# Altium footprint library ATROTECH.PcbLib: 334 footprints (part 2 of 21)
Each footprint in its own frame and in the unit in brackets; x right, y up, seen from the top. Pads: shape width x height; smd on the part's side, far side on the other; paste and mask are expansions set on the pad; w line width, h text height; cw(c..) or ccw(c..) is an arc to the next point about the centre after c.
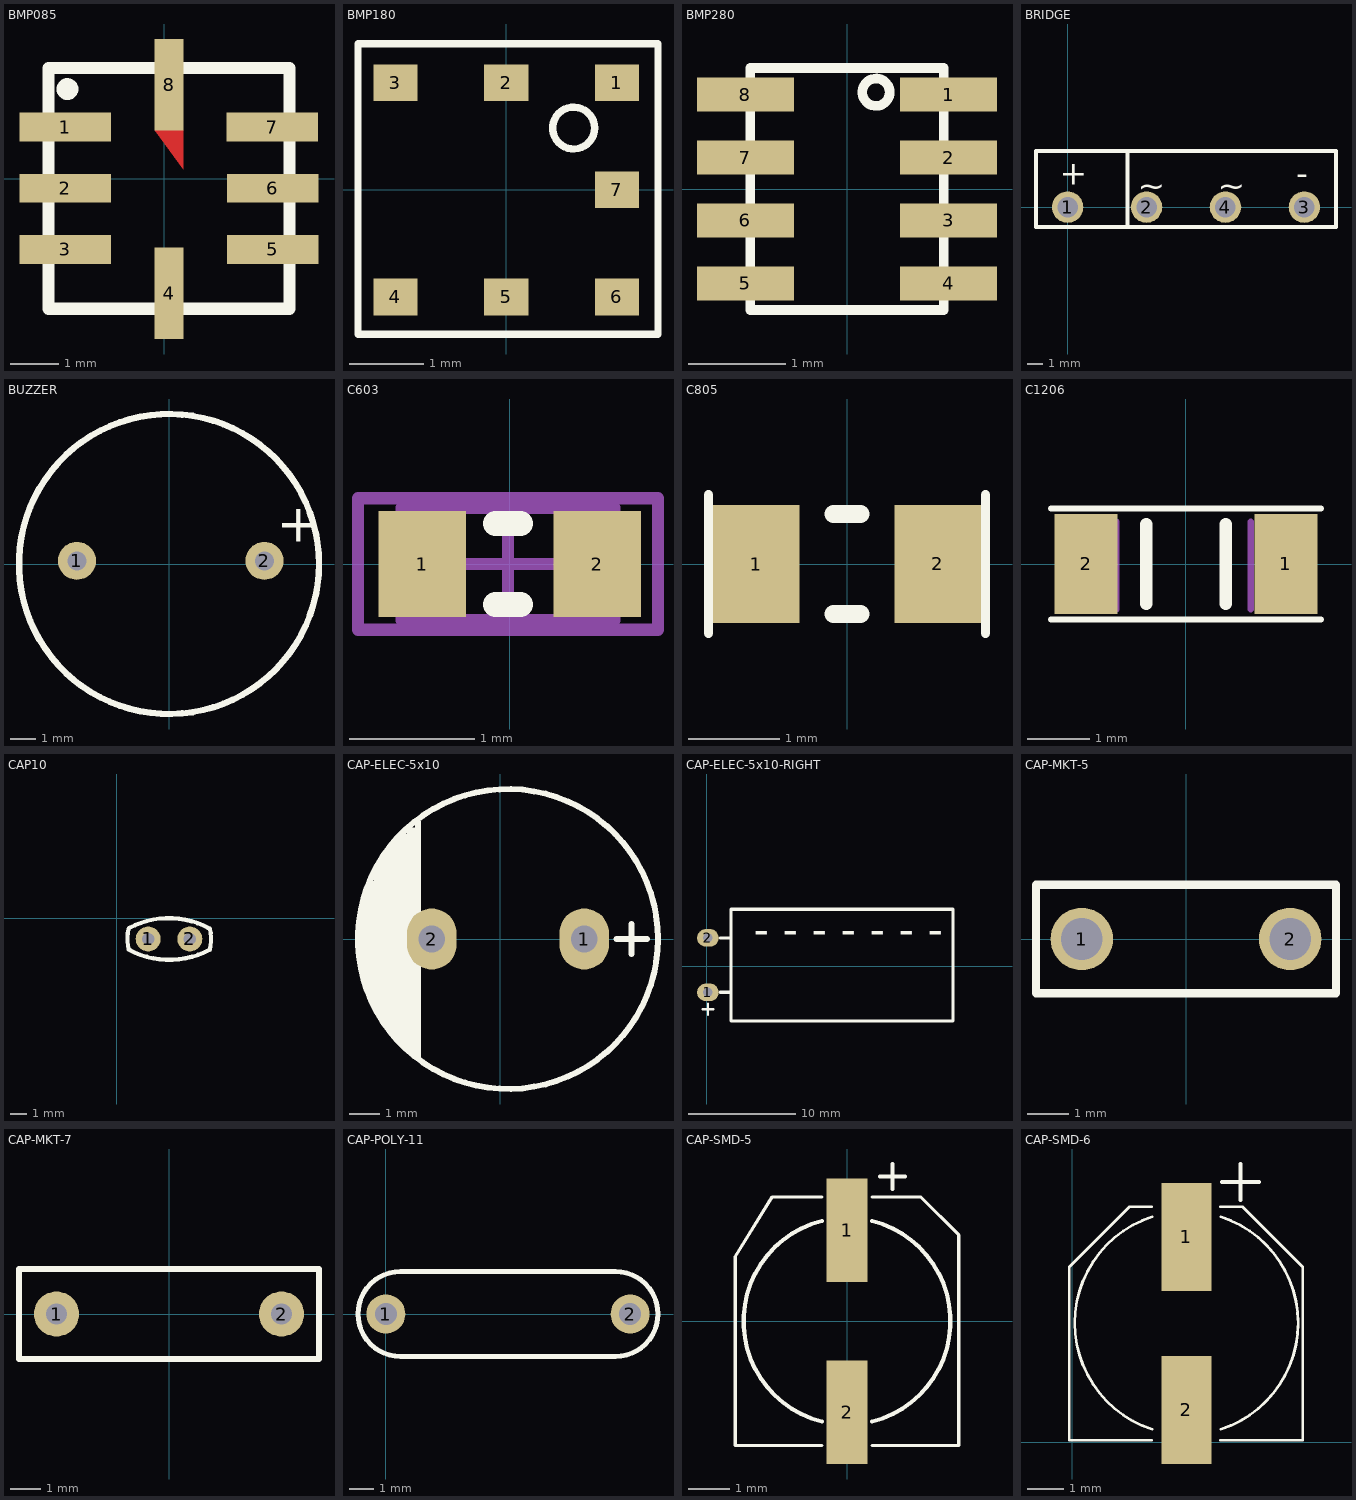
[diagram p1: the footprints below, top view; thin cyan lines are the x and y axes]

## BMP085 [mm] "Digital pressure sensor"
pads (8):
  rect 1.9x0.6 smd: 1(-2.05,1.07) 2(-2.05,-0.2) 3(-2.05,-1.47) 5(2.25,-1.47) 6(2.25,-0.2) 7(2.24,1.07)
  rect 0.6x1.9 smd: 4(0.1,-2.38) 8(0.1,1.95)
Top Layer:
  region: -0.2,1 0.4,1 0.4,0.6 0.4,0.2
Top Overlay:
  circle w0.254: c-2.01,1.86 r0.1
  lines w0.254: -2.4,-2.7 -2.4,2.3 2.6,2.3 2.6,-2.7 -2.4,-2.7

## BMP180 [mm]
height 2
pads (7):
  rect 0.6x0.5 smd: 1(1.5,1.45) 2(0,1.45) 3(-1.5,1.45) 4(-1.5,-1.45) 5(0,-1.45) 6(1.5,-1.45) 7(1.5,0)
Top Overlay:
  circle w0.1: c0.913,0.836 r0.284
  lines w0.1: -2.008,-1.958 2.056,-1.958 2.056,1.979 -2.008,1.979 -2.008,-1.958
3D body "BMP180.STEP": height 0.98, standoff 0, extent -1.875,-1.778 1.925,1.822

## BMP280 [mm]
pads (8):
  rect 1x0.35 smd: 1(1.05,0.975) 2(1.05,0.325) 3(1.05,-0.325) 4(1.05,-0.975) 5(-1.05,-0.975) 6(-1.05,-0.325) 7(-1.05,0.325) 8(-1.05,0.975)
Top Overlay:
  circle w0.1: c0.3,1 r0.141
  lines w0.1: -1,-1.25 -1,1.25 1,1.25 1,-1.25 -1,-1.25
3D body "User Library-BST-BMP280.step": height 1, standoff 0, extent -1,-1.25 1,1.25

## BRIDGE [mm] "DIODE BRIDGE"
height 15
pads (4):
  round 2 hole 1.3: 1(0,0) 2(5,0) 3(15,0) 4(10,0)
Top Overlay:
  lines w0.254: 3.81,-1.27 3.81,3.556 ; -2,-1.27 -2,3.556 17,3.556 17,-1.27 -2,-1.27
  text "-" at 14.478,1.397 h1.52
  text "~" at 9.525,0.635 h1.52
  text "~" at 4.445,0.635 h1.52
  text "+" at -0.508,1.397 h1.52

## BUZZER [mil]
pads (2):
  round 60 hole 30: 1(-145,5) 2(150.28,5)
Top Overlay:
  circle w10: c0,0 r236.22
  text "+" at 170,35 h60
3D body "buzzer.stp": height 374.02, standoff -216.54, extent -236.21,-231.22 236.23,241.22

## C603 [mm]
pads (2):
  rect 0.7x0.85 smd: 1(-0.7,0) 2(0.7,0)
Top Overlay:
  lines w0.2: -0.113,-0.325 0.087,-0.325 ; -0.113,0.325 0.087,0.325
Mechanical 13:
  lines w0.1: -0.863,-0.45 0.837,-0.45 0.837,0.45 -0.863,0.45 -0.863,-0.45
Mechanical 15:
  lines w0.1: -0.463,0 0.437,0 ; -0.013,-0.45 -0.013,0.45 ; -1.213,-0.525 1.187,-0.525 1.187,0.525 -1.213,0.525 -1.213,-0.525
3D body "cap 0603.STEP": height 0.6, standoff 0, extent -0.762,-0.381 0.762,0.381

## C805 [mm]
pads (2):
  rect 0.95x1.3 smd: 1(-1,0) 2(1,0)
Top Overlay:
  lines w0.1: -1.524,-0.762 -1.524,0.762 ; 1.524,-0.762 1.524,0.762
  lines w0.2: -0.15,-0.55 0.15,-0.55 ; -0.15,0.55 0.15,0.55
3D body "User Library-0805 SMD Resistor (2).SLDPRT": height 0.78, standoff 0, extent -1,-0.625 1,0.625

## C1206 [mm]
pads (2):
  rect 1x1.6 smd: 1(1.6,0) 2(-1.6,0)
Top Overlay:
  lines w0.1: -2.159,-0.889 2.159,-0.889 ; -2.159,0.889 2.159,0.889
  lines w0.2: -0.635,-0.635 -0.635,0.635 ; 0.635,-0.635 0.635,0.635
Mechanical 13:
  lines w0.1: -1.113,-0.726 -1.113,0.674 ; 1.037,-0.726 1.037,0.674
3D body "User Library-1206 SMD Capacitor.step": height 1, standoff 0, extent -1.6,-0.8 1.6,0.8

## CAP10 [mil]
pads (2):
  round 60 hole 30: 1(75,-50) 2(175,-50)
Top Overlay:
  lines w10: 27.99,-25.75 ccw(c125,-50) 28.29,-75.45 ccw(c125.6,105.1) 223.41,-75.18 ; 29.18,-23.44 cw(c124.4,-205.1) 221.71,-24.55 ; 222.79,-75.73 ccw(c125,-50) 223.1,-25.48
3D body "Cap 100n.STEP": height 272.48, standoff -39.37, extent 11,-83.39 240.87,-16.6

## CAP-ELEC-5x10 [mil]
pads (2):
  oval 65x80 hole 35: 1(110,0) 2(-90,0)
Top Overlay:
  circle w7.87: c10,0 r196.85
  rectangle: -167.83,-74.62 -107.98,71.44
  lines w7.87: -180.91,-47 -180.91,46 ; -173.91,-63 -173.91,62 ; -167.83,-74.62 -167.83,71.44 ; -167.83,73.02 -107.98,73.02 ; -165.07,-77.77 -107.98,-77.77 ; -164.68,80.5 -107.98,80.5 ; -163.89,-84.86 -107.98,-84.86 ; -161.53,87.19 -107.98,87.19 ; -160.35,-91.94 -107.98,-91.94 ; -157.98,93.88 -107.98,93.88 ; -156.8,-98.64 -107.98,-98.64 ; -154.05,100.57 -107.98,100.57 ; -153.26,-105.33 -107.98,-105.72 ; -149.72,107.66 -107.98,107.66 ; -148.14,-112.42 -107.98,-112.42 ; -145.39,114.35 -107.98,114.35 ; -142.63,-119.9 -107.98,-119.9 ; -140.27,121.05 -107.98,121.05 ; -137.12,-127.38 -107.98,-127.38 ; -134.76,127.35 -134.36,127.74 -107.98,127.74 ; -130.82,-134.46 -107.98,-134.46 ; -128.46,134.43 -128.06,134.83 -107.98,134.83 ; -124.13,-141.16 -107.98,-141.16 ; -120.98,142.31 -107.98,142.31 ; -117.83,-146.67 -107.98,-146.67 ; -107.98,-155.72 -107.98,153.72 ; 152.13,0 192.13,0 ; 172.13,-20 172.13,20
3D body "SW3dPS-Cap electro 10x12.5x5.0mm.STEP": height 512.81, standoff -136.91, extent -187.7,-197 208,198.7

## CAP-ELEC-5x10-RIGHT [mil]
pads (2):
  oval 80x65 hole 35: 1(5,-95) 2(5,105)
Top Overlay:
  lines w7.87: -15,-157.13 25,-157.13 ; 5,-177.13 5,-137.13
  lines w11.81: 50,-95 85,-95 ; 50,105 85,105 ; 90,-200 905,-200 905,210 90,210 90,-200
  text "- - - - - - -" at 870,205 h196.85
3D body "User Library-eca-2em220.step": height 401.57, standoff -118.11, extent -6.7,-200 906.69,209.49

## CAP-MKT-5 [mm]
pads (2):
  round 1.5 hole 1: 1(-2.5,0) 2(2.5,0)
Top Overlay:
  lines w0.2: -3.6,-1.3 -3.6,1.3 3.6,1.3 3.6,-1.3 -3.6,-1.3
3D body "User Library-B32529-2_5X6_5X7_2.STEP": height 6.5, standoff -3, extent -3.6,-1.25 3.6,1.25

## CAP-MKT-7 [mm]
pads (2):
  round 1.5 hole 0.7: 1(-3.75,0) 2(3.75,0)
Top Overlay:
  lines w0.2: -5,-1.5 -5,1.5 5,1.5 5,-1.5 -5,-1.5
3D body: height 8, standoff 0, extent -5,-1.5 5,1.5

## CAP-POLY-11 [mm]
pads (2):
  round 1.6 hole 0.9: 1(0,0) 2(10,0)
Top Overlay:
  lines w0.2: 0.6,-1.738 cw(c0.6,0) 0.6,1.738 9.4,1.738 cw(c9.4,0) 9.4,-1.738 0.6,-1.738
3D body "__-6.STEP": height 11, standoff -3, extent -0.5,-1.75 10.5,1.75

## CAP-SMD-5 [mm]
pads (2):
  rect 1x2.5 smd: 1(0,2.2) 2(0,-2.2)
Top Overlay:
  lines w0.076: -0.6,-3 -2.7,-3 -2.7,1.562 ; -0.6,3 -1.813,3 ; 0.6,-3 2.7,-3 2.7,2.088 ; 0.6,3 1.788,3 ; -2.7,1.562 -1.813,3 ; -2.7,1.562 -1.813,3 ; 1.788,3 2.7,2.088 ; 1.788,3 2.7,2.088
  lines w0.1: -0.606,-2.425 cw(c0,0) -0.606,2.425 ; 0.606,-2.425 ccw(c0,0) 0.606,2.425 ; 0.8,3.5 1.4,3.5 ; 1.1,3.2 1.1,3.8
3D body "User Library-CAP SMD SVP 5_0x5_9.STEP": height 5.9, standoff 0, extent -2.65,-3 2.65,3

## CAP-SMD-6 [mil]
pads (2):
  rect 55x118 smd: 1(125,224) 2(125,35)
Top Overlay:
  lines w3: 87,2 -3,2 ; 87,257 63,257 ; 87.6,13.87 cw(c125,130) 87.6,246.13 ; 162,2 252,2 ; 162,257 186,257 ; 162.4,13.87 ccw(c125,130) 162.4,246.13 ; -3,2 -3,191 ; -3,2 -3,191 ; -3,191 63,257 ; -3,191 63,257 ; 186,257 252,191 ; 186,257 252,191 ; 252,2 252,191 ; 252,2 252,191
  lines w3.94: 163.39,284.02 204.72,284.02 ; 184.06,264.33 184.06,303.7
3D body "CAP-POL6.STEP": height 215.27, standoff 0.31, extent 5,-9.6 243.19,269.6